# Altium footprint library SMD_Bauteile.PcbLib: 355 footprints (part 19 of 23)
Each footprint in its own frame and in the unit in brackets; x right, y up, seen from the top. Pads: shape width x height; smd on the part's side, far side on the other; paste and mask are expansions set on the pad; w line width, h text height; cw(c..) or ccw(c..) is an arc to the next point about the centre after c.
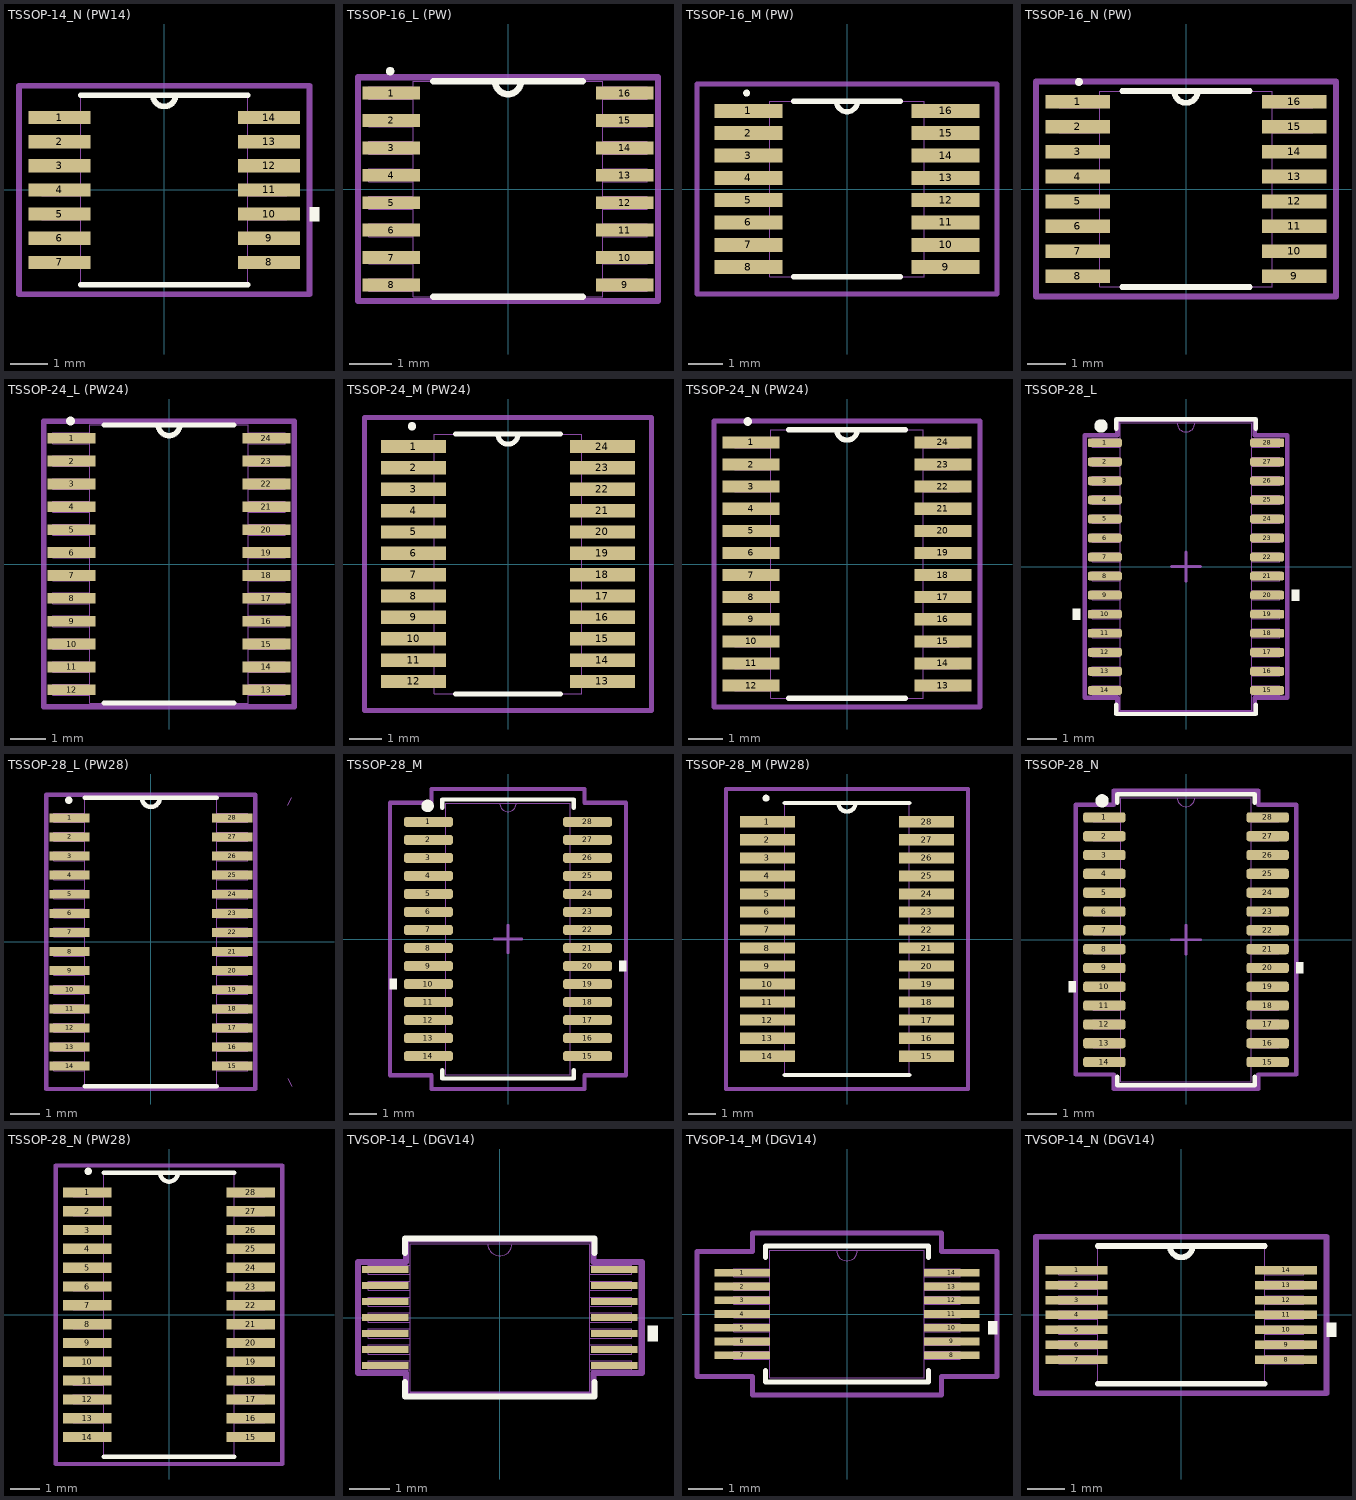
[diagram p18: the footprints below, top view; thin cyan lines are the x and y axes]

## TSSOP-14_N (PW14) [mil] "TSSOP, 14-Leads, Body 5.10x4.5mm, Pitch 0.65mm, IPC Medium Density"
height 47.24
pads (14):
  rect 66x14 smd: 1(-111,76.77) 2(-111,51.18) 3(-111,25.59) 4(-111,0) 5(-111,-25.59) 6(-111,-51.18) 7(-111,-76.77) 8(111,-76.77) 9(111,-51.18) 10(111,-25.59) 11(111,0) 12(111,25.59) 13(111,51.18) 14(111,76.77)
Top Overlay:
  region: 154,-18.09 164,-18.09 164,-33.09 154,-33.09
  lines w6: -88.5,-100.5 88.5,-100.5 ; -88.5,100.5 88.5,100.5 ; -12,100.5 ccw(c0,100.5) 12,100.5
Mech Misc 1:
  lines w0: -12,100.5 ccw(c0,100.5) 12,100.5
  lines w1: -130,-82.77 -88.5,-82.77 -88.5,-70.77 -130,-70.77 -130,-82.77 ; -130,-57.18 -88.5,-57.18 -88.5,-45.18 -130,-45.18 -130,-57.18 ; -130,-31.59 -88.5,-31.59 -88.5,-19.59 -130,-19.59 -130,-31.59 ; -130,-6 -88.5,-6 -88.5,6 -130,6 -130,-6 ; -130,19.59 -88.5,19.59 -88.5,31.59 -130,31.59 -130,19.59 ; -130,45.18 -88.5,45.18 -88.5,57.18 -130,57.18 -130,45.18 ; -130,70.77 -88.5,70.77 -88.5,82.77 -130,82.77 -130,70.77 ; -88.5,-100.5 -88.5,100.5 88.5,100.5 88.5,-100.5 -88.5,-100.5 ; 88.5,-82.77 130,-82.77 130,-70.77 88.5,-70.77 88.5,-82.77 ; 88.5,-57.18 130,-57.18 130,-45.18 88.5,-45.18 88.5,-57.18 ; 88.5,-31.59 130,-31.59 130,-19.59 88.5,-19.59 88.5,-31.59 ; 88.5,-6 130,-6 130,6 88.5,6 88.5,-6 ; 88.5,19.59 130,19.59 130,31.59 88.5,31.59 88.5,19.59 ; 88.5,45.18 130,45.18 130,57.18 88.5,57.18 88.5,45.18 ; 88.5,70.77 130,70.77 130,82.77 88.5,82.77 88.5,70.77
Mech 15:
  lines w6: -154,-110.5 154,-110.5 154,110.5 -154,110.5 -154,-110.5
3D body "PW0014A.stp": height 44.49, standoff 0, extent -125.98,-98.42 125.99,98.43

## TSSOP-16_L (PW) [mil]
height 47.24
pads (16):
  rect 54x12 smd: 1(-109,89.57) 2(-109,63.98) 3(-109,38.39) 4(-109,12.8) 5(-109,-12.8) 6(-109,-38.39) 7(-109,-63.98) 8(-109,-89.57) 9(109,-89.57) 10(109,-63.98) 11(109,-38.39) 12(109,-12.8) 13(109,12.8) 14(109,38.39) 15(109,63.98) 16(109,89.57)
Top Overlay:
  circle w7.87: c-110,110 r0.1
  lines w6: -69.86,-100.5 69.86,-100.5 ; -69.86,100.5 69.86,100.5 ; -12,100.5 ccw(c0,100.5) 12,100.5
Mech Misc 1:
  lines w0: -12,100.5 ccw(c0,100.5) 12,100.5
  lines w1: -130,-95.57 -130,-83.57 -88.5,-83.57 -88.5,-95.57 -130,-95.57 ; -130,-69.98 -130,-57.98 -88.5,-57.98 -88.5,-69.98 -130,-69.98 ; -130,-44.39 -130,-32.39 -88.5,-32.39 -88.5,-44.39 -130,-44.39 ; -130,-18.8 -130,-6.8 -88.5,-6.8 -88.5,-18.8 -130,-18.8 ; -130,6.8 -130,18.8 -88.5,18.8 -88.5,6.8 -130,6.8 ; -130,32.39 -130,44.39 -88.5,44.39 -88.5,32.39 -130,32.39 ; -130,57.98 -130,69.98 -88.5,69.98 -88.5,57.98 -130,57.98 ; -130,83.57 -130,95.57 -88.5,95.57 -88.5,83.57 -130,83.57 ; -88.5,-100.5 88.5,-100.5 88.5,100.5 -88.5,100.5 -88.5,-100.5 ; 88.5,-95.57 88.5,-83.57 130,-83.57 130,-95.57 88.5,-95.57 ; 88.5,-69.98 88.5,-57.98 130,-57.98 130,-69.98 88.5,-69.98 ; 88.5,-44.39 88.5,-32.39 130,-32.39 130,-44.39 88.5,-44.39 ; 88.5,-18.8 88.5,-6.8 130,-6.8 130,-18.8 88.5,-18.8 ; 88.5,6.8 88.5,18.8 130,18.8 130,6.8 88.5,6.8 ; 88.5,32.39 88.5,44.39 130,44.39 130,32.39 88.5,32.39 ; 88.5,57.98 88.5,69.98 130,69.98 130,57.98 88.5,57.98 ; 88.5,83.57 88.5,95.57 130,95.57 130,83.57 88.5,83.57
Mech 15:
  lines w6: -140,-104.5 -140,104.5 140,104.5 140,-104.5 -140,-104.5
3D body: height 10, standoff 0, extent 0,0 10,10
3D body "TSSOP-16 (PW).stp": height 44.49, standoff 0, extent -125.98,-98.42 125.99,98.43

## TSSOP-16_M (PW) [mil]
height 47.24
pads (16):
  rect 78x16 smd: 1(-113,89.57) 2(-113,63.98) 3(-113,38.39) 4(-113,12.8) 5(-113,-12.8) 6(-113,-38.39) 7(-113,-63.98) 8(-113,-89.57) 9(113,-89.57) 10(113,-63.98) 11(113,-38.39) 12(113,-12.8) 13(113,12.8) 14(113,38.39) 15(113,63.98) 16(113,89.57)
Top Overlay:
  circle w7.87: c-115.1,110 r0.1
  lines w6: -61.23,-100.5 61.23,-100.5 ; -61.23,100.5 61.23,100.5 ; -12,100.5 ccw(c0,100.5) 12,100.5
Mech Misc 1:
  lines w0: -12,100.5 ccw(c0,100.5) 12,100.5
  lines w1: -130,-95.57 -88.5,-95.57 -88.5,-83.57 -130,-83.57 -130,-95.57 ; -130,-69.98 -88.5,-69.98 -88.5,-57.98 -130,-57.98 -130,-69.98 ; -130,-44.39 -88.5,-44.39 -88.5,-32.39 -130,-32.39 -130,-44.39 ; -130,-18.8 -88.5,-18.8 -88.5,-6.8 -130,-6.8 -130,-18.8 ; -130,6.8 -88.5,6.8 -88.5,18.8 -130,18.8 -130,6.8 ; -130,32.39 -88.5,32.39 -88.5,44.39 -130,44.39 -130,32.39 ; -130,57.98 -88.5,57.98 -88.5,69.98 -130,69.98 -130,57.98 ; -130,83.57 -88.5,83.57 -88.5,95.57 -130,95.57 -130,83.57 ; -88.5,-100.5 -88.5,100.5 88.5,100.5 88.5,-100.5 -88.5,-100.5 ; 88.5,-95.57 130,-95.57 130,-83.57 88.5,-83.57 88.5,-95.57 ; 88.5,-69.98 130,-69.98 130,-57.98 88.5,-57.98 88.5,-69.98 ; 88.5,-44.39 130,-44.39 130,-32.39 88.5,-32.39 88.5,-44.39 ; 88.5,-18.8 130,-18.8 130,-6.8 88.5,-6.8 88.5,-18.8 ; 88.5,6.8 130,6.8 130,18.8 88.5,18.8 88.5,6.8 ; 88.5,32.39 130,32.39 130,44.39 88.5,44.39 88.5,32.39 ; 88.5,57.98 130,57.98 130,69.98 88.5,69.98 88.5,57.98 ; 88.5,83.57 130,83.57 130,95.57 88.5,95.57 88.5,83.57
Mech 15:
  lines w6: -172,-120.5 172,-120.5 172,120.5 -172,120.5 -172,-120.5
3D body: height 10, standoff 0, extent 0,0 10,10
3D body "TSSOP-16 (PW).stp": height 44.49, standoff 0, extent -125.98,-98.42 125.99,98.43

## TSSOP-16_N (PW) [mil]
height 47.24
pads (16):
  rect 66x14 smd: 1(-111,89.57) 2(-111,63.98) 3(-111,38.39) 4(-111,12.8) 5(-111,-12.8) 6(-111,-38.39) 7(-111,-63.98) 8(-111,-89.57) 9(111,-89.57) 10(111,-63.98) 11(111,-38.39) 12(111,-12.8) 13(111,12.8) 14(111,38.39) 15(111,63.98) 16(111,89.57)
Top Overlay:
  circle w7.87: c-110,110 r0.1
  lines w6: -65.5,-100.5 65.5,-100.5 ; -65.5,100.5 65.5,100.5 ; -12,100.5 ccw(c0,100.5) 12,100.5
Mech Misc 1:
  lines w0: -12,100.5 ccw(c0,100.5) 12,100.5
  lines w1: -130,-95.57 -88.5,-95.57 -88.5,-83.57 -130,-83.57 -130,-95.57 ; -130,-69.98 -88.5,-69.98 -88.5,-57.98 -130,-57.98 -130,-69.98 ; -130,-44.39 -88.5,-44.39 -88.5,-32.39 -130,-32.39 -130,-44.39 ; -130,-18.8 -88.5,-18.8 -88.5,-6.8 -130,-6.8 -130,-18.8 ; -130,6.8 -88.5,6.8 -88.5,18.8 -130,18.8 -130,6.8 ; -130,32.39 -88.5,32.39 -88.5,44.39 -130,44.39 -130,32.39 ; -130,57.98 -88.5,57.98 -88.5,69.98 -130,69.98 -130,57.98 ; -130,83.57 -88.5,83.57 -88.5,95.57 -130,95.57 -130,83.57 ; -88.5,-100.5 -88.5,100.5 88.5,100.5 88.5,-100.5 -88.5,-100.5 ; 88.5,-95.57 130,-95.57 130,-83.57 88.5,-83.57 88.5,-95.57 ; 88.5,-69.98 130,-69.98 130,-57.98 88.5,-57.98 88.5,-69.98 ; 88.5,-44.39 130,-44.39 130,-32.39 88.5,-32.39 88.5,-44.39 ; 88.5,-18.8 130,-18.8 130,-6.8 88.5,-6.8 88.5,-18.8 ; 88.5,6.8 130,6.8 130,18.8 88.5,18.8 88.5,6.8 ; 88.5,32.39 130,32.39 130,44.39 88.5,44.39 88.5,32.39 ; 88.5,57.98 130,57.98 130,69.98 88.5,69.98 88.5,57.98 ; 88.5,83.57 130,83.57 130,95.57 88.5,95.57 88.5,83.57
Mech 15:
  lines w6: -154,-110.5 154,-110.5 154,110.5 -154,110.5 -154,-110.5
3D body: height 10, standoff 0, extent 0,0 10,10
3D body "TSSOP-16 (PW).stp": height 44.49, standoff 0, extent -125.98,-98.42 125.99,98.43

## TSSOP-24_L (PW24) [mil]
height 47.24
pads (24):
  rect 54x12 smd: 1(-109,140.75) 2(-109,115.16) 3(-109,89.57) 4(-109,63.98) 5(-109,38.39) 6(-109,12.8) 7(-109,-12.8) 8(-109,-38.39) 9(-109,-63.98) 10(-109,-89.57) 11(-109,-115.16) 12(-109,-140.75) 13(109,-140.75) 14(109,-115.16) 15(109,-89.57) 16(109,-63.98) 17(109,-38.39) 18(109,-12.8) 19(109,12.8) 20(109,38.39) 21(109,63.98) 22(109,89.57) 23(109,115.16) 24(109,140.75)
Top Overlay:
  circle w10: c-110,160 r0.01
  lines w6: -72.25,-155.5 72.25,-155.5 ; -72.25,155.5 72.25,155.5 ; -12,155.5 ccw(c0,155.5) 12,155.5
Mech Misc 1:
  lines w0: -12,155.5 ccw(c0,155.5) 12,155.5
  lines w1: -130,-146.75 -88.5,-146.75 -88.5,-134.75 -130,-134.75 -130,-146.75 ; -130,-121.16 -88.5,-121.16 -88.5,-109.16 -130,-109.16 -130,-121.16 ; -130,-95.57 -88.5,-95.57 -88.5,-83.57 -130,-83.57 -130,-95.57 ; -130,-69.98 -88.5,-69.98 -88.5,-57.98 -130,-57.98 -130,-69.98 ; -130,-44.39 -88.5,-44.39 -88.5,-32.39 -130,-32.39 -130,-44.39 ; -130,-18.8 -88.5,-18.8 -88.5,-6.8 -130,-6.8 -130,-18.8 ; -130,6.8 -88.5,6.8 -88.5,18.8 -130,18.8 -130,6.8 ; -130,32.39 -88.5,32.39 -88.5,44.39 -130,44.39 -130,32.39 ; -130,57.98 -88.5,57.98 -88.5,69.98 -130,69.98 -130,57.98 ; -130,83.57 -88.5,83.57 -88.5,95.57 -130,95.57 -130,83.57 ; -130,109.16 -88.5,109.16 -88.5,121.16 -130,121.16 -130,109.16 ; -130,134.75 -88.5,134.75 -88.5,146.75 -130,146.75 -130,134.75 ; -88.5,-155.5 -88.5,155.5 88.5,155.5 88.5,-155.5 -88.5,-155.5 ; 88.5,-146.75 130,-146.75 130,-134.75 88.5,-134.75 88.5,-146.75 ; 88.5,-121.16 130,-121.16 130,-109.16 88.5,-109.16 88.5,-121.16 ; 88.5,-95.57 130,-95.57 130,-83.57 88.5,-83.57 88.5,-95.57 ; 88.5,-69.98 130,-69.98 130,-57.98 88.5,-57.98 88.5,-69.98 ; 88.5,-44.39 130,-44.39 130,-32.39 88.5,-32.39 88.5,-44.39 ; 88.5,-18.8 130,-18.8 130,-6.8 88.5,-6.8 88.5,-18.8 ; 88.5,6.8 130,6.8 130,18.8 88.5,18.8 88.5,6.8 ; 88.5,32.39 130,32.39 130,44.39 88.5,44.39 88.5,32.39 ; 88.5,57.98 130,57.98 130,69.98 88.5,69.98 88.5,57.98 ; 88.5,83.57 130,83.57 130,95.57 88.5,95.57 88.5,83.57 ; 88.5,109.16 130,109.16 130,121.16 88.5,121.16 88.5,109.16 ; 88.5,134.75 130,134.75 130,146.75 88.5,146.75 88.5,134.75
Mech 15:
  lines w6: -140,-159.5 140,-159.5 140,159.5 -140,159.5 -140,-159.5
3D body "TSSOP-24-PW.stp": height 44.49, standoff 0, extent -125.98,-153.54 125.99,153.55
3D body: height 10, standoff 0, extent 0,0 10,10

## TSSOP-24_M (PW24) [mil]
height 47.24
pads (24):
  rect 78x16 smd: 1(-113,140.75) 2(-113,115.16) 3(-113,89.57) 4(-113,63.98) 5(-113,38.39) 6(-113,12.8) 7(-113,-12.8) 8(-113,-38.39) 9(-113,-63.98) 10(-113,-89.57) 11(-113,-115.16) 12(-113,-140.75) 13(113,-140.75) 14(113,-115.16) 15(113,-89.57) 16(113,-63.98) 17(113,-38.39) 18(113,-12.8) 19(113,12.8) 20(113,38.39) 21(113,63.98) 22(113,89.57) 23(113,115.16) 24(113,140.75)
Top Overlay:
  circle w10: c-115,165 r0.01
  lines w6: -62.77,-155.5 62.77,-155.5 ; -62.77,155.5 62.77,155.5 ; -12,155.5 ccw(c0,155.5) 12,155.5
Mech Misc 1:
  lines w0: -12,155.5 ccw(c0,155.5) 12,155.5
  lines w1: -130,-146.75 -88.5,-146.75 -88.5,-134.75 -130,-134.75 -130,-146.75 ; -130,-121.16 -88.5,-121.16 -88.5,-109.16 -130,-109.16 -130,-121.16 ; -130,-95.57 -88.5,-95.57 -88.5,-83.57 -130,-83.57 -130,-95.57 ; -130,-69.98 -88.5,-69.98 -88.5,-57.98 -130,-57.98 -130,-69.98 ; -130,-44.39 -88.5,-44.39 -88.5,-32.39 -130,-32.39 -130,-44.39 ; -130,-18.8 -88.5,-18.8 -88.5,-6.8 -130,-6.8 -130,-18.8 ; -130,6.8 -88.5,6.8 -88.5,18.8 -130,18.8 -130,6.8 ; -130,32.39 -88.5,32.39 -88.5,44.39 -130,44.39 -130,32.39 ; -130,57.98 -88.5,57.98 -88.5,69.98 -130,69.98 -130,57.98 ; -130,83.57 -88.5,83.57 -88.5,95.57 -130,95.57 -130,83.57 ; -130,109.16 -88.5,109.16 -88.5,121.16 -130,121.16 -130,109.16 ; -130,134.75 -88.5,134.75 -88.5,146.75 -130,146.75 -130,134.75 ; -88.5,-155.5 -88.5,155.5 88.5,155.5 88.5,-155.5 -88.5,-155.5 ; 88.5,-146.75 130,-146.75 130,-134.75 88.5,-134.75 88.5,-146.75 ; 88.5,-121.16 130,-121.16 130,-109.16 88.5,-109.16 88.5,-121.16 ; 88.5,-95.57 130,-95.57 130,-83.57 88.5,-83.57 88.5,-95.57 ; 88.5,-69.98 130,-69.98 130,-57.98 88.5,-57.98 88.5,-69.98 ; 88.5,-44.39 130,-44.39 130,-32.39 88.5,-32.39 88.5,-44.39 ; 88.5,-18.8 130,-18.8 130,-6.8 88.5,-6.8 88.5,-18.8 ; 88.5,6.8 130,6.8 130,18.8 88.5,18.8 88.5,6.8 ; 88.5,32.39 130,32.39 130,44.39 88.5,44.39 88.5,32.39 ; 88.5,57.98 130,57.98 130,69.98 88.5,69.98 88.5,57.98 ; 88.5,83.57 130,83.57 130,95.57 88.5,95.57 88.5,83.57 ; 88.5,109.16 130,109.16 130,121.16 88.5,121.16 88.5,109.16 ; 88.5,134.75 130,134.75 130,146.75 88.5,146.75 88.5,134.75
Mech 15:
  lines w6: -172,-175.5 172,-175.5 172,175.5 -172,175.5 -172,-175.5
3D body: height 10, standoff 0, extent 0,0 10,10
3D body "TSSOP-24-PW.stp": height 44.49, standoff 0, extent -125.98,-153.53 125.99,153.55

## TSSOP-24_N (PW24) [mil]
height 47.24
pads (24):
  rect 66x14 smd: 1(-111,140.75) 2(-111,115.16) 3(-111,89.57) 4(-111,63.98) 5(-111,38.39) 6(-111,12.8) 7(-111,-12.8) 8(-111,-38.39) 9(-111,-63.98) 10(-111,-89.57) 11(-111,-115.16) 12(-111,-140.75) 13(111,-140.75) 14(111,-115.16) 15(111,-89.57) 16(111,-63.98) 17(111,-38.39) 18(111,-12.8) 19(111,12.8) 20(111,38.39) 21(111,63.98) 22(111,89.57) 23(111,115.16) 24(111,140.75)
Top Overlay:
  circle w10: c-115,165 r0.01
  lines w6: -67.44,-155.5 67.44,-155.5 ; -67.44,155.5 67.44,155.5 ; -12,155.5 ccw(c0,155.5) 12,155.5
Mech Misc 1:
  lines w0: -12,155.5 ccw(c0,155.5) 12,155.5
  lines w1: -130,-146.75 -88.5,-146.75 -88.5,-134.75 -130,-134.75 -130,-146.75 ; -130,-121.16 -88.5,-121.16 -88.5,-109.16 -130,-109.16 -130,-121.16 ; -130,-95.57 -88.5,-95.57 -88.5,-83.57 -130,-83.57 -130,-95.57 ; -130,-69.98 -88.5,-69.98 -88.5,-57.98 -130,-57.98 -130,-69.98 ; -130,-44.39 -88.5,-44.39 -88.5,-32.39 -130,-32.39 -130,-44.39 ; -130,-18.8 -88.5,-18.8 -88.5,-6.8 -130,-6.8 -130,-18.8 ; -130,6.8 -88.5,6.8 -88.5,18.8 -130,18.8 -130,6.8 ; -130,32.39 -88.5,32.39 -88.5,44.39 -130,44.39 -130,32.39 ; -130,57.98 -88.5,57.98 -88.5,69.98 -130,69.98 -130,57.98 ; -130,83.57 -88.5,83.57 -88.5,95.57 -130,95.57 -130,83.57 ; -130,109.16 -88.5,109.16 -88.5,121.16 -130,121.16 -130,109.16 ; -130,134.75 -88.5,134.75 -88.5,146.75 -130,146.75 -130,134.75 ; -88.5,-155.5 -88.5,155.5 88.5,155.5 88.5,-155.5 -88.5,-155.5 ; 88.5,-146.75 130,-146.75 130,-134.75 88.5,-134.75 88.5,-146.75 ; 88.5,-121.16 130,-121.16 130,-109.16 88.5,-109.16 88.5,-121.16 ; 88.5,-95.57 130,-95.57 130,-83.57 88.5,-83.57 88.5,-95.57 ; 88.5,-69.98 130,-69.98 130,-57.98 88.5,-57.98 88.5,-69.98 ; 88.5,-44.39 130,-44.39 130,-32.39 88.5,-32.39 88.5,-44.39 ; 88.5,-18.8 130,-18.8 130,-6.8 88.5,-6.8 88.5,-18.8 ; 88.5,6.8 130,6.8 130,18.8 88.5,18.8 88.5,6.8 ; 88.5,32.39 130,32.39 130,44.39 88.5,44.39 88.5,32.39 ; 88.5,57.98 130,57.98 130,69.98 88.5,69.98 88.5,57.98 ; 88.5,83.57 130,83.57 130,95.57 88.5,95.57 88.5,83.57 ; 88.5,109.16 130,109.16 130,121.16 88.5,121.16 88.5,109.16 ; 88.5,134.75 130,134.75 130,146.75 88.5,146.75 88.5,134.75
Mech 15:
  lines w6: -154,-165.5 154,-165.5 154,165.5 -154,165.5 -154,-165.5
3D body: height 10, standoff 0, extent 0,0 10,10
3D body "TSSOP-24-PW.stp": height 44.49, standoff 0, extent -125.98,-153.54 125.99,153.55

## TSSOP-28_L [mm]
height 1.1
pads (28):
  rrect50% 1.162x0.305 smd: 1(-2.769,4.225) 2(-2.769,3.575) 3(-2.769,2.925) 4(-2.769,2.275) 5(-2.769,1.625) 6(-2.769,0.975) 7(-2.769,0.325) 8(-2.769,-0.325) 9(-2.769,-0.975) 10(-2.769,-1.625) 11(-2.769,-2.275) 12(-2.769,-2.925) 13(-2.769,-3.575) 14(-2.769,-4.225) 15(2.769,-4.225) 16(2.769,-3.575) 17(2.769,-2.925) 18(2.769,-2.275) 19(2.769,-1.625) 20(2.769,-0.975) 21(2.769,-0.325) 22(2.769,0.325) 23(2.769,0.975) 24(2.769,1.625) 25(2.769,2.275) 26(2.769,2.925) 27(2.769,3.575) 28(2.769,4.225)
Top Overlay:
  circle w0.254: c-2.9,4.8 r0.1
  region: 3.604,-0.784 3.858,-0.784 3.858,-1.165 3.604,-1.165
  region: -3.604,-1.434 -3.858,-1.434 -3.858,-1.815 -3.604,-1.815
  lines w0.152: -2.375,-4.71 -2.375,-5.029 2.375,-5.029 2.375,-4.71 ; -2.375,4.71 -2.375,5.029 2.375,5.029 2.375,4.71
Bottom Designator:
  lines w0.152: -3.452,-4.479 -2.349,-4.479 -2.349,-5.004 2.349,-5.004 2.349,-4.479 3.452,-4.479 3.452,4.479 2.349,4.479 2.349,5.004 -2.349,5.004 -2.349,4.479 -3.452,4.479 -3.452,-4.479
Bottom 3D Body:
  lines w0.1: -0.5,0 0.5,0 ; 0,-0.5 0,0.5
Top Courtyard (Mech14):
  lines w0: -0.305,4.902 ccw(c0,4.902) 0.305,4.902
  lines w0.025: -3.2,-4.377 -3.2,-4.073 -2.248,-4.073 -2.248,-4.377 -3.2,-4.377 ; -3.2,-3.727 -2.248,-3.727 -2.248,-3.423 -3.2,-3.423 -3.2,-3.727 ; -3.2,-3.077 -3.2,-2.773 -2.248,-2.773 -2.248,-3.077 -3.2,-3.077 ; -3.2,-2.427 -3.2,-2.123 -2.248,-2.123 -2.248,-2.427 -3.2,-2.427 ; -3.2,-1.777 -2.248,-1.777 -2.248,-1.473 -3.2,-1.473 -3.2,-1.777 ; -3.2,-1.127 -3.2,-0.823 -2.248,-0.823 -2.248,-1.127 -3.2,-1.127 ; -3.2,-0.477 -3.2,-0.173 -2.248,-0.173 -2.248,-0.477 -3.2,-0.477 ; -3.2,0.173 -2.248,0.173 -2.248,0.477 -3.2,0.477 -3.2,0.173 ; -3.2,0.823 -3.2,1.127 -2.248,1.127 -2.248,0.823 -3.2,0.823 ; -3.2,1.473 -3.2,1.777 -2.248,1.777 -2.248,1.473 -3.2,1.473 ; -3.2,2.123 -3.2,2.427 -2.248,2.427 -2.248,2.123 -3.2,2.123 ; -3.2,2.773 -2.248,2.773 -2.248,3.077 -3.2,3.077 -3.2,2.773 ; -3.2,3.423 -3.2,3.727 -2.248,3.727 -2.248,3.423 -3.2,3.423 ; -3.2,4.073 -3.2,4.377 -2.248,4.377 -2.248,4.073 -3.2,4.073 ; -2.248,-4.902 -2.248,4.902 2.248,4.902 2.248,-4.902 -2.248,-4.902 ; 2.248,-4.377 2.248,-4.073 3.2,-4.073 3.2,-4.377 2.248,-4.377 ; 2.248,-3.727 2.248,-3.423 3.2,-3.423 3.2,-3.727 2.248,-3.727 ; 2.248,-3.077 2.248,-2.773 3.2,-2.773 3.2,-3.077 2.248,-3.077 ; 2.248,-2.427 2.248,-2.123 3.2,-2.123 3.2,-2.427 2.248,-2.427 ; 2.248,-1.777 2.248,-1.473 3.2,-1.473 3.2,-1.777 2.248,-1.777 ; 2.248,-1.127 2.248,-0.823 3.2,-0.823 3.2,-1.127 2.248,-1.127 ; 2.248,-0.477 2.248,-0.173 3.2,-0.173 3.2,-0.477 2.248,-0.477 ; 2.248,0.173 2.248,0.477 3.2,0.477 3.2,0.173 2.248,0.173 ; 2.248,0.823 3.2,0.823 3.2,1.127 2.248,1.127 2.248,0.823 ; 2.248,1.473 2.248,1.777 3.2,1.777 3.2,1.473 2.248,1.473 ; 2.248,2.123 2.248,2.427 3.2,2.427 3.2,2.123 2.248,2.123 ; 2.248,2.773 3.2,2.773 3.2,3.077 2.248,3.077 2.248,2.773 ; 2.248,3.423 2.248,3.727 3.2,3.727 3.2,3.423 2.248,3.423 ; 2.248,4.073 2.248,4.377 3.2,4.377 3.2,4.073 2.248,4.073
3D body "RU_28_ADI.step": height 1.2, standoff 0, extent -3.2,-4.902 3.2,4.902

## TSSOP-28_L (PW28) [mil]
height 47.24
pads (28):
  rect 54x12 smd: 1(-109,166.34) 2(-109,140.75) 3(-109,115.16) 4(-109,89.57) 5(-109,63.98) 6(-109,38.39) 7(-109,12.8) 8(-109,-12.8) 9(-109,-38.39) 10(-109,-63.98) 11(-109,-89.57) 12(-109,-115.16) 13(-109,-140.75) 14(-109,-166.34) 15(109,-166.34) 16(109,-140.75) 17(109,-115.16) 18(109,-89.57) 19(109,-63.98) 20(109,-38.39) 21(109,-12.8) 22(109,12.8) 23(109,38.39) 24(109,63.98) 25(109,89.57) 26(109,115.16) 27(109,140.75) 28(109,166.34)
Top Overlay:
  circle w10: c-110,190 r0.01
  lines w6: -88.5,-193 88.5,-193 ; -88.5,193 88.5,193 ; -12,193 ccw(c0,193) 12,193
Top Courtyard:
  lines w1: 183.5,-183 188.5,-193 ; 183.5,183 188.5,193
Mech Misc 1:
  lines w0: -12,193 ccw(c0,193) 12,193
  lines w1: -130,-172.34 -130,-160.34 -88.5,-160.34 -88.5,-172.34 -130,-172.34 ; -130,-146.75 -130,-134.75 -88.5,-134.75 -88.5,-146.75 -130,-146.75 ; -130,-121.16 -130,-109.16 -88.5,-109.16 -88.5,-121.16 -130,-121.16 ; -130,-95.57 -130,-83.57 -88.5,-83.57 -88.5,-95.57 -130,-95.57 ; -130,-69.98 -130,-57.98 -88.5,-57.98 -88.5,-69.98 -130,-69.98 ; -130,-44.39 -130,-32.39 -88.5,-32.39 -88.5,-44.39 -130,-44.39 ; -130,-18.8 -130,-6.8 -88.5,-6.8 -88.5,-18.8 -130,-18.8 ; -130,6.8 -130,18.8 -88.5,18.8 -88.5,6.8 -130,6.8 ; -130,32.39 -130,44.39 -88.5,44.39 -88.5,32.39 -130,32.39 ; -130,57.98 -130,69.98 -88.5,69.98 -88.5,57.98 -130,57.98 ; -130,83.57 -130,95.57 -88.5,95.57 -88.5,83.57 -130,83.57 ; -130,109.16 -130,121.16 -88.5,121.16 -88.5,109.16 -130,109.16 ; -130,134.75 -130,146.75 -88.5,146.75 -88.5,134.75 -130,134.75 ; -130,160.34 -130,172.34 -88.5,172.34 -88.5,160.34 -130,160.34 ; -88.5,-193 88.5,-193 88.5,193 -88.5,193 -88.5,-193 ; 88.5,-172.34 88.5,-160.34 130,-160.34 130,-172.34 88.5,-172.34 ; 88.5,-146.75 88.5,-134.75 130,-134.75 130,-146.75 88.5,-146.75 ; 88.5,-121.16 88.5,-109.16 130,-109.16 130,-121.16 88.5,-121.16 ; 88.5,-95.57 88.5,-83.57 130,-83.57 130,-95.57 88.5,-95.57 ; 88.5,-69.98 88.5,-57.98 130,-57.98 130,-69.98 88.5,-69.98 ; 88.5,-44.39 88.5,-32.39 130,-32.39 130,-44.39 88.5,-44.39 ; 88.5,-18.8 88.5,-6.8 130,-6.8 130,-18.8 88.5,-18.8 ; 88.5,6.8 88.5,18.8 130,18.8 130,6.8 88.5,6.8 ; 88.5,32.39 88.5,44.39 130,44.39 130,32.39 88.5,32.39 ; 88.5,57.98 88.5,69.98 130,69.98 130,57.98 88.5,57.98 ; 88.5,83.57 88.5,95.57 130,95.57 130,83.57 88.5,83.57 ; 88.5,109.16 88.5,121.16 130,121.16 130,109.16 88.5,109.16 ; 88.5,134.75 88.5,146.75 130,146.75 130,134.75 88.5,134.75 ; 88.5,160.34 88.5,172.34 130,172.34 130,160.34 88.5,160.34
Mech 15:
  lines w6: -140,-197 -140,197 140,197 140,-197 -140,-197
3D body: height 10, standoff 0, extent 0,0 10,10
3D body "TSSOP-28.stp": height 44.49, standoff 0, extent -125.98,-190.94 125.99,190.95

## TSSOP-28_M [mm]
height 1.1
pads (28):
  rrect50% 1.762x0.355 smd: 1(-2.869,4.225) 2(-2.869,3.575) 3(-2.869,2.925) 4(-2.869,2.275) 5(-2.869,1.625) 6(-2.869,0.975) 7(-2.869,0.325) 8(-2.869,-0.325) 9(-2.869,-0.975) 10(-2.869,-1.625) 11(-2.869,-2.275) 12(-2.869,-2.925) 13(-2.869,-3.575) 14(-2.869,-4.225) 15(2.869,-4.225) 16(2.869,-3.575) 17(2.869,-2.925) 18(2.869,-2.275) 19(2.869,-1.625) 20(2.869,-0.975) 21(2.869,-0.325) 22(2.869,0.325) 23(2.869,0.975) 24(2.869,1.625) 25(2.869,2.275) 26(2.869,2.925) 27(2.869,3.575) 28(2.869,4.225)
Top Overlay:
  circle w0.254: c-2.9,4.8 r0.1
  region: -4.004,-1.434 -4.258,-1.434 -4.258,-1.815 -4.004,-1.815
  region: 4.004,-0.784 4.258,-0.784 4.258,-1.165 4.004,-1.165
  lines w0.152: -2.375,-4.735 -2.375,-5.029 2.375,-5.029 2.375,-4.735 ; -2.375,4.735 -2.375,5.029 2.375,5.029 2.375,4.735
Bottom Designator:
  lines w0.152: -4.258,-4.91 -4.258,4.91 -2.756,4.91 -2.756,5.41 2.756,5.41 2.756,4.91 4.258,4.91 4.258,-4.91 2.756,-4.91 2.756,-5.41 -2.756,-5.41 -2.756,-4.91 -4.258,-4.91
Bottom 3D Body:
  lines w0.1: -0.5,0 0.5,0 ; 0,-0.5 0,0.5
Top Courtyard (Mech14):
  lines w0: -0.305,4.902 ccw(c0,4.902) 0.305,4.902
  lines w0.025: -3.2,-4.377 -2.248,-4.377 -2.248,-4.073 -3.2,-4.073 -3.2,-4.377 ; -3.2,-3.727 -3.2,-3.423 -2.248,-3.423 -2.248,-3.727 -3.2,-3.727 ; -3.2,-3.077 -2.248,-3.077 -2.248,-2.773 -3.2,-2.773 -3.2,-3.077 ; -3.2,-2.427 -2.248,-2.427 -2.248,-2.123 -3.2,-2.123 -3.2,-2.427 ; -3.2,-1.777 -3.2,-1.473 -2.248,-1.473 -2.248,-1.777 -3.2,-1.777 ; -3.2,-1.127 -3.2,-0.823 -2.248,-0.823 -2.248,-1.127 -3.2,-1.127 ; -3.2,-0.477 -2.248,-0.477 -2.248,-0.173 -3.2,-0.173 -3.2,-0.477 ; -3.2,0.173 -2.248,0.173 -2.248,0.477 -3.2,0.477 -3.2,0.173 ; -3.2,0.823 -2.248,0.823 -2.248,1.127 -3.2,1.127 -3.2,0.823 ; -3.2,1.473 -2.248,1.473 -2.248,1.777 -3.2,1.777 -3.2,1.473 ; -3.2,2.123 -3.2,2.427 -2.248,2.427 -2.248,2.123 -3.2,2.123 ; -3.2,2.773 -2.248,2.773 -2.248,3.077 -3.2,3.077 -3.2,2.773 ; -3.2,3.423 -2.248,3.423 -2.248,3.727 -3.2,3.727 -3.2,3.423 ; -3.2,4.073 -3.2,4.377 -2.248,4.377 -2.248,4.073 -3.2,4.073 ; -2.248,-4.902 -2.248,4.902 2.248,4.902 2.248,-4.902 -2.248,-4.902 ; 2.248,-4.377 2.248,-4.073 3.2,-4.073 3.2,-4.377 2.248,-4.377 ; 2.248,-3.727 3.2,-3.727 3.2,-3.423 2.248,-3.423 2.248,-3.727 ; 2.248,-3.077 3.2,-3.077 3.2,-2.773 2.248,-2.773 2.248,-3.077 ; 2.248,-2.427 3.2,-2.427 3.2,-2.123 2.248,-2.123 2.248,-2.427 ; 2.248,-1.777 3.2,-1.777 3.2,-1.473 2.248,-1.473 2.248,-1.777 ; 2.248,-1.127 3.2,-1.127 3.2,-0.823 2.248,-0.823 2.248,-1.127 ; 2.248,-0.477 3.2,-0.477 3.2,-0.173 2.248,-0.173 2.248,-0.477 ; 2.248,0.173 3.2,0.173 3.2,0.477 2.248,0.477 2.248,0.173 ; 2.248,0.823 3.2,0.823 3.2,1.127 2.248,1.127 2.248,0.823 ; 2.248,1.473 3.2,1.473 3.2,1.777 2.248,1.777 2.248,1.473 ; 2.248,2.123 2.248,2.427 3.2,2.427 3.2,2.123 2.248,2.123 ; 2.248,2.773 3.2,2.773 3.2,3.077 2.248,3.077 2.248,2.773 ; 2.248,3.423 3.2,3.423 3.2,3.727 2.248,3.727 2.248,3.423 ; 2.248,4.073 3.2,4.073 3.2,4.377 2.248,4.377 2.248,4.073
3D body "RU_28_ADI.step": height 1.2, standoff 0, extent -3.2,-4.902 3.2,4.902

## TSSOP-28_M (PW28) [mil]
height 47.24
pads (28):
  rect 78x16 smd: 1(-113,166.34) 2(-113,140.75) 3(-113,115.16) 4(-113,89.57) 5(-113,63.98) 6(-113,38.39) 7(-113,12.8) 8(-113,-12.8) 9(-113,-38.39) 10(-113,-63.98) 11(-113,-89.57) 12(-113,-115.16) 13(-113,-140.75) 14(-113,-166.34) 15(113,-166.34) 16(113,-140.75) 17(113,-115.16) 18(113,-89.57) 19(113,-63.98) 20(113,-38.39) 21(113,-12.8) 22(113,12.8) 23(113,38.39) 24(113,63.98) 25(113,89.57) 26(113,115.16) 27(113,140.75) 28(113,166.34)
Top Overlay:
  circle w10: c-115,200 r0.01
  lines w6: -88.5,-193 88.5,-193 ; -88.5,193 88.5,193 ; -12,193 ccw(c0,193) 12,193
Mech Misc 1:
  lines w0: -12,193 ccw(c0,193) 12,193
  lines w1: -130,-172.34 -130,-160.34 -88.5,-160.34 -88.5,-172.34 -130,-172.34 ; -130,-146.75 -130,-134.75 -88.5,-134.75 -88.5,-146.75 -130,-146.75 ; -130,-121.16 -130,-109.16 -88.5,-109.16 -88.5,-121.16 -130,-121.16 ; -130,-95.57 -130,-83.57 -88.5,-83.57 -88.5,-95.57 -130,-95.57 ; -130,-69.98 -130,-57.98 -88.5,-57.98 -88.5,-69.98 -130,-69.98 ; -130,-44.39 -130,-32.39 -88.5,-32.39 -88.5,-44.39 -130,-44.39 ; -130,-18.8 -130,-6.8 -88.5,-6.8 -88.5,-18.8 -130,-18.8 ; -130,6.8 -130,18.8 -88.5,18.8 -88.5,6.8 -130,6.8 ; -130,32.39 -130,44.39 -88.5,44.39 -88.5,32.39 -130,32.39 ; -130,57.98 -130,69.98 -88.5,69.98 -88.5,57.98 -130,57.98 ; -130,83.57 -130,95.57 -88.5,95.57 -88.5,83.57 -130,83.57 ; -130,109.16 -130,121.16 -88.5,121.16 -88.5,109.16 -130,109.16 ; -130,134.75 -130,146.75 -88.5,146.75 -88.5,134.75 -130,134.75 ; -130,160.34 -130,172.34 -88.5,172.34 -88.5,160.34 -130,160.34 ; -88.5,-193 88.5,-193 88.5,193 -88.5,193 -88.5,-193 ; 88.5,-172.34 88.5,-160.34 130,-160.34 130,-172.34 88.5,-172.34 ; 88.5,-146.75 88.5,-134.75 130,-134.75 130,-146.75 88.5,-146.75 ; 88.5,-121.16 88.5,-109.16 130,-109.16 130,-121.16 88.5,-121.16 ; 88.5,-95.57 88.5,-83.57 130,-83.57 130,-95.57 88.5,-95.57 ; 88.5,-69.98 88.5,-57.98 130,-57.98 130,-69.98 88.5,-69.98 ; 88.5,-44.39 88.5,-32.39 130,-32.39 130,-44.39 88.5,-44.39 ; 88.5,-18.8 88.5,-6.8 130,-6.8 130,-18.8 88.5,-18.8 ; 88.5,6.8 88.5,18.8 130,18.8 130,6.8 88.5,6.8 ; 88.5,32.39 88.5,44.39 130,44.39 130,32.39 88.5,32.39 ; 88.5,57.98 88.5,69.98 130,69.98 130,57.98 88.5,57.98 ; 88.5,83.57 88.5,95.57 130,95.57 130,83.57 88.5,83.57 ; 88.5,109.16 88.5,121.16 130,121.16 130,109.16 88.5,109.16 ; 88.5,134.75 88.5,146.75 130,146.75 130,134.75 88.5,134.75 ; 88.5,160.34 88.5,172.34 130,172.34 130,160.34 88.5,160.34
Mech 15:
  lines w6: -172,-213 -172,213 172,213 172,-213 -172,-213
3D body: height 10, standoff 0, extent 0,0 10,10
3D body "TSSOP-28.stp": height 44.49, standoff 0, extent -125.98,-190.94 125.99,190.95

## TSSOP-28_N [mm]
height 1.1
pads (28):
  rrect50% 1.462x0.355 smd: 1(-2.819,4.225) 2(-2.819,3.575) 3(-2.819,2.925) 4(-2.819,2.275) 5(-2.819,1.625) 6(-2.819,0.975) 7(-2.819,0.325) 8(-2.819,-0.325) 9(-2.819,-0.975) 10(-2.819,-1.625) 11(-2.819,-2.275) 12(-2.819,-2.925) 13(-2.819,-3.575) 14(-2.819,-4.225) 15(2.819,-4.225) 16(2.819,-3.575) 17(2.819,-2.925) 18(2.819,-2.275) 19(2.819,-1.625) 20(2.819,-0.975) 21(2.819,-0.325) 22(2.819,0.325) 23(2.819,0.975) 24(2.819,1.625) 25(2.819,2.275) 26(2.819,2.925) 27(2.819,3.575) 28(2.819,4.225)
Top Overlay:
  circle w0.254: c-2.9,4.8 r0.1
  region: -3.804,-1.434 -4.058,-1.434 -4.058,-1.815 -3.804,-1.815
  region: 3.804,-0.784 4.058,-0.784 4.058,-1.165 3.804,-1.165
  lines w0.152: -2.375,-4.735 -2.375,-5.029 2.375,-5.029 2.375,-4.735 ; -2.375,4.735 -2.375,5.029 2.375,5.029 2.375,4.735
Bottom Designator:
  lines w0.152: -3.804,-4.656 -3.804,4.656 -2.502,4.656 -2.502,5.156 2.502,5.156 2.502,4.656 3.804,4.656 3.804,-4.656 2.502,-4.656 2.502,-5.156 -2.502,-5.156 -2.502,-4.656 -3.804,-4.656
Bottom 3D Body:
  lines w0.1: -0.5,0 0.5,0 ; 0,-0.5 0,0.5
Top Courtyard (Mech14):
  lines w0: -0.305,4.902 ccw(c0,4.902) 0.305,4.902
  lines w0.025: -3.2,-4.377 -2.248,-4.377 -2.248,-4.073 -3.2,-4.073 -3.2,-4.377 ; -3.2,-3.727 -3.2,-3.423 -2.248,-3.423 -2.248,-3.727 -3.2,-3.727 ; -3.2,-3.077 -2.248,-3.077 -2.248,-2.773 -3.2,-2.773 -3.2,-3.077 ; -3.2,-2.427 -2.248,-2.427 -2.248,-2.123 -3.2,-2.123 -3.2,-2.427 ; -3.2,-1.777 -3.2,-1.473 -2.248,-1.473 -2.248,-1.777 -3.2,-1.777 ; -3.2,-1.127 -2.248,-1.127 -2.248,-0.823 -3.2,-0.823 -3.2,-1.127 ; -3.2,-0.477 -2.248,-0.477 -2.248,-0.173 -3.2,-0.173 -3.2,-0.477 ; -3.2,0.173 -2.248,0.173 -2.248,0.477 -3.2,0.477 -3.2,0.173 ; -3.2,0.823 -2.248,0.823 -2.248,1.127 -3.2,1.127 -3.2,0.823 ; -3.2,1.473 -2.248,1.473 -2.248,1.777 -3.2,1.777 -3.2,1.473 ; -3.2,2.123 -2.248,2.123 -2.248,2.427 -3.2,2.427 -3.2,2.123 ; -3.2,2.773 -2.248,2.773 -2.248,3.077 -3.2,3.077 -3.2,2.773 ; -3.2,3.423 -2.248,3.423 -2.248,3.727 -3.2,3.727 -3.2,3.423 ; -3.2,4.073 -2.248,4.073 -2.248,4.377 -3.2,4.377 -3.2,4.073 ; -2.248,-4.902 2.248,-4.902 2.248,4.902 -2.248,4.902 -2.248,-4.902 ; 2.248,-4.377 2.248,-4.073 3.2,-4.073 3.2,-4.377 2.248,-4.377 ; 2.248,-3.727 3.2,-3.727 3.2,-3.423 2.248,-3.423 2.248,-3.727 ; 2.248,-3.077 3.2,-3.077 3.2,-2.773 2.248,-2.773 2.248,-3.077 ; 2.248,-2.427 3.2,-2.427 3.2,-2.123 2.248,-2.123 2.248,-2.427 ; 2.248,-1.777 3.2,-1.777 3.2,-1.473 2.248,-1.473 2.248,-1.777 ; 2.248,-1.127 3.2,-1.127 3.2,-0.823 2.248,-0.823 2.248,-1.127 ; 2.248,-0.477 3.2,-0.477 3.2,-0.173 2.248,-0.173 2.248,-0.477 ; 2.248,0.173 3.2,0.173 3.2,0.477 2.248,0.477 2.248,0.173 ; 2.248,0.823 3.2,0.823 3.2,1.127 2.248,1.127 2.248,0.823 ; 2.248,1.473 3.2,1.473 3.2,1.777 2.248,1.777 2.248,1.473 ; 2.248,2.123 3.2,2.123 3.2,2.427 2.248,2.427 2.248,2.123 ; 2.248,2.773 2.248,3.077 3.2,3.077 3.2,2.773 2.248,2.773 ; 2.248,3.423 3.2,3.423 3.2,3.727 2.248,3.727 2.248,3.423 ; 2.248,4.073 3.2,4.073 3.2,4.377 2.248,4.377 2.248,4.073
3D body "RU_28_ADI.step": height 1.2, standoff 0, extent -3.2,-4.902 3.2,4.902

## TSSOP-28_N (PW28) [mil]
height 47.24
pads (28):
  rect 66x14 smd: 1(-111,166.34) 2(-111,140.75) 3(-111,115.16) 4(-111,89.57) 5(-111,63.98) 6(-111,38.39) 7(-111,12.8) 8(-111,-12.8) 9(-111,-38.39) 10(-111,-63.98) 11(-111,-89.57) 12(-111,-115.16) 13(-111,-140.75) 14(-111,-166.34) 15(111,-166.34) 16(111,-140.75) 17(111,-115.16) 18(111,-89.57) 19(111,-63.98) 20(111,-38.39) 21(111,-12.8) 22(111,12.8) 23(111,38.39) 24(111,63.98) 25(111,89.57) 26(111,115.16) 27(111,140.75) 28(111,166.34)
Top Overlay:
  circle w10: c-110,195 r0.01
  lines w6: -88.5,-193 88.5,-193 ; -88.5,193 88.5,193 ; -12,193 ccw(c0,193) 12,193
Mech Misc 1:
  lines w0: -12,193 ccw(c0,193) 12,193
  lines w1: -130,-172.34 -88.5,-172.34 -88.5,-160.34 -130,-160.34 -130,-172.34 ; -130,-146.75 -88.5,-146.75 -88.5,-134.75 -130,-134.75 -130,-146.75 ; -130,-121.16 -88.5,-121.16 -88.5,-109.16 -130,-109.16 -130,-121.16 ; -130,-95.57 -88.5,-95.57 -88.5,-83.57 -130,-83.57 -130,-95.57 ; -130,-69.98 -88.5,-69.98 -88.5,-57.98 -130,-57.98 -130,-69.98 ; -130,-44.39 -88.5,-44.39 -88.5,-32.39 -130,-32.39 -130,-44.39 ; -130,-18.8 -88.5,-18.8 -88.5,-6.8 -130,-6.8 -130,-18.8 ; -130,6.8 -88.5,6.8 -88.5,18.8 -130,18.8 -130,6.8 ; -130,32.39 -88.5,32.39 -88.5,44.39 -130,44.39 -130,32.39 ; -130,57.98 -88.5,57.98 -88.5,69.98 -130,69.98 -130,57.98 ; -130,83.57 -88.5,83.57 -88.5,95.57 -130,95.57 -130,83.57 ; -130,109.16 -88.5,109.16 -88.5,121.16 -130,121.16 -130,109.16 ; -130,134.75 -88.5,134.75 -88.5,146.75 -130,146.75 -130,134.75 ; -130,160.34 -88.5,160.34 -88.5,172.34 -130,172.34 -130,160.34 ; -88.5,-193 -88.5,193 88.5,193 88.5,-193 -88.5,-193 ; 88.5,-172.34 130,-172.34 130,-160.34 88.5,-160.34 88.5,-172.34 ; 88.5,-146.75 130,-146.75 130,-134.75 88.5,-134.75 88.5,-146.75 ; 88.5,-121.16 130,-121.16 130,-109.16 88.5,-109.16 88.5,-121.16 ; 88.5,-95.57 130,-95.57 130,-83.57 88.5,-83.57 88.5,-95.57 ; 88.5,-69.98 130,-69.98 130,-57.98 88.5,-57.98 88.5,-69.98 ; 88.5,-44.39 130,-44.39 130,-32.39 88.5,-32.39 88.5,-44.39 ; 88.5,-18.8 130,-18.8 130,-6.8 88.5,-6.8 88.5,-18.8 ; 88.5,6.8 130,6.8 130,18.8 88.5,18.8 88.5,6.8 ; 88.5,32.39 130,32.39 130,44.39 88.5,44.39 88.5,32.39 ; 88.5,57.98 130,57.98 130,69.98 88.5,69.98 88.5,57.98 ; 88.5,83.57 130,83.57 130,95.57 88.5,95.57 88.5,83.57 ; 88.5,109.16 130,109.16 130,121.16 88.5,121.16 88.5,109.16 ; 88.5,134.75 130,134.75 130,146.75 88.5,146.75 88.5,134.75 ; 88.5,160.34 130,160.34 130,172.34 88.5,172.34 88.5,160.34
Mech 15:
  lines w6: -154,-203 154,-203 154,203 -154,203 -154,-203
3D body: height 10, standoff 0, extent 0,0 10,10
3D body "TSSOP-28.stp": height 44.49, standoff 0, extent -125.98,-190.94 125.99,190.95

## TVSOP-14_L (DGV14) [mil]
height 47.24
pads (14):
  rect 46x7 smd paste+0 mask+0: 1(-113,47.24) 2(-113,31.5) 3(-113,15.75) 4(-113,0) 5(-113,-15.75) 6(-113,-31.5) 7(-113,-47.24) 8(113,-47.24) 9(113,-31.5) 10(113,-15.75) 11(113,0) 12(113,15.75) 13(113,31.5) 14(113,47.24)
Top Overlay:
  region: 146,-8.25 156,-8.25 156,-23.25 146,-23.25
  lines w6: -93.5,-63.84 -93.5,-78 93.5,-78 93.5,-63.84 ; -93.5,63.84 -93.5,78 93.5,78 93.5,63.84
Mech Misc 1:
  lines w0: -12,73 ccw(c0,73) 12,73
  lines w1: -130,-51.74 -88.5,-51.74 -88.5,-42.74 -130,-42.74 -130,-51.74 ; -130,-36 -88.5,-36 -88.5,-27 -130,-27 -130,-36 ; -130,-20.25 -88.5,-20.25 -88.5,-11.25 -130,-11.25 -130,-20.25 ; -130,-4.5 -88.5,-4.5 -88.5,4.5 -130,4.5 -130,-4.5 ; -130,11.25 -88.5,11.25 -88.5,20.25 -130,20.25 -130,11.25 ; -130,27 -88.5,27 -88.5,36 -130,36 -130,27 ; -130,42.74 -88.5,42.74 -88.5,51.74 -130,51.74 -130,42.74 ; -88.5,-73 -88.5,73 88.5,73 88.5,-73 -88.5,-73 ; 88.5,-51.74 130,-51.74 130,-42.74 88.5,-42.74 88.5,-51.74 ; 88.5,-36 130,-36 130,-27 88.5,-27 88.5,-36 ; 88.5,-20.25 130,-20.25 130,-11.25 88.5,-11.25 88.5,-20.25 ; 88.5,-4.5 130,-4.5 130,4.5 88.5,4.5 88.5,-4.5 ; 88.5,11.25 130,11.25 130,20.25 88.5,20.25 88.5,11.25 ; 88.5,27 130,27 130,36 88.5,36 88.5,27 ; 88.5,42.74 130,42.74 130,51.74 88.5,51.74 88.5,42.74
Mech 15:
  lines w6: -140,-54.74 -92.5,-54.74 -92.5,-77 92.5,-77 92.5,-54.74 140,-54.74 140,54.74 92.5,54.74 92.5,77 -92.5,77 -92.5,54.74 -140,54.74 -140,-54.74
3D body: height 10, standoff 0, extent 0,0 10,10
3D body "DGV14.step": height 47.09, standoff 0, extent -130,-72.99 130,72.99

## TVSOP-14_M (DGV14) [mil]
height 47.24
pads (14):
  rect 63.5x9 smd paste+0 mask+0: 1(-120.25,47.24) 2(-120.25,31.5) 3(-120.25,15.75) 4(-120.25,0) 5(-120.25,-15.75) 6(-120.25,-31.5) 7(-120.25,-47.24) 8(120.25,-47.24) 9(120.25,-31.5) 10(120.25,-15.75) 11(120.25,0) 12(120.25,15.75) 13(120.25,31.5) 14(120.25,47.24)
Top Overlay:
  region: 162,-8.25 172,-8.25 172,-23.25 162,-23.25
  lines w6: -93.5,-64.84 -93.5,-78 93.5,-78 93.5,-64.84 ; -93.5,64.84 -93.5,78 93.5,78 93.5,64.84
Mech Misc 1:
  lines w0: -12,73 ccw(c0,73) 12,73
  lines w1: -130,-51.74 -130,-42.74 -88.5,-42.74 -88.5,-51.74 -130,-51.74 ; -130,-36 -130,-27 -88.5,-27 -88.5,-36 -130,-36 ; -130,-20.25 -130,-11.25 -88.5,-11.25 -88.5,-20.25 -130,-20.25 ; -130,-4.5 -130,4.5 -88.5,4.5 -88.5,-4.5 -130,-4.5 ; -130,11.25 -130,20.25 -88.5,20.25 -88.5,11.25 -130,11.25 ; -130,27 -130,36 -88.5,36 -88.5,27 -130,27 ; -130,42.74 -130,51.74 -88.5,51.74 -88.5,42.74 -130,42.74 ; -88.5,-73 88.5,-73 88.5,73 -88.5,73 -88.5,-73 ; 88.5,-51.74 88.5,-42.74 130,-42.74 130,-51.74 88.5,-51.74 ; 88.5,-36 88.5,-27 130,-27 130,-36 88.5,-36 ; 88.5,-20.25 88.5,-11.25 130,-11.25 130,-20.25 88.5,-20.25 ; 88.5,-4.5 88.5,4.5 130,4.5 130,-4.5 88.5,-4.5 ; 88.5,11.25 88.5,20.25 130,20.25 130,11.25 88.5,11.25 ; 88.5,27 88.5,36 130,36 130,27 88.5,27 ; 88.5,42.74 88.5,51.74 130,51.74 130,42.74 88.5,42.74
Mech 15:
  lines w6: -172,-71.74 -172,71.74 -108.5,71.74 -108.5,93 108.5,93 108.5,71.74 172,71.74 172,-71.74 108.5,-71.74 108.5,-93 -108.5,-93 -108.5,-71.74 -172,-71.74
3D body: height 10, standoff 0, extent 0,0 10,10
3D body "DGV14.step": height 47.09, standoff 0, extent -130,-72.99 130,73

## TVSOP-14_N (DGV14) [mil]
height 47.24
pads (14):
  rect 66x9 smd: 1(-111,47.24) 2(-111,31.5) 3(-111,15.75) 4(-111,0) 5(-111,-15.75) 6(-111,-31.5) 7(-111,-47.24) 8(111,-47.24) 9(111,-31.5) 10(111,-15.75) 11(111,0) 12(111,15.75) 13(111,31.5) 14(111,47.24)
Top Overlay:
  region: 154,-8.25 164,-8.25 164,-23.25 154,-23.25
  lines w6: -88.5,-73 88.5,-73 ; -88.5,73 88.5,73 ; -12,73 ccw(c0,73) 12,73
Mech Misc 1:
  lines w0: -12,73 ccw(c0,73) 12,73
  lines w1: -130,-51.74 -88.5,-51.74 -88.5,-42.74 -130,-42.74 -130,-51.74 ; -130,-36 -88.5,-36 -88.5,-27 -130,-27 -130,-36 ; -130,-20.25 -88.5,-20.25 -88.5,-11.25 -130,-11.25 -130,-20.25 ; -130,-4.5 -88.5,-4.5 -88.5,4.5 -130,4.5 -130,-4.5 ; -130,11.25 -88.5,11.25 -88.5,20.25 -130,20.25 -130,11.25 ; -130,27 -88.5,27 -88.5,36 -130,36 -130,27 ; -130,42.74 -88.5,42.74 -88.5,51.74 -130,51.74 -130,42.74 ; -88.5,-73 -88.5,73 88.5,73 88.5,-73 -88.5,-73 ; 88.5,-51.74 130,-51.74 130,-42.74 88.5,-42.74 88.5,-51.74 ; 88.5,-36 130,-36 130,-27 88.5,-27 88.5,-36 ; 88.5,-20.25 130,-20.25 130,-11.25 88.5,-11.25 88.5,-20.25 ; 88.5,-4.5 130,-4.5 130,4.5 88.5,4.5 88.5,-4.5 ; 88.5,11.25 130,11.25 130,20.25 88.5,20.25 88.5,11.25 ; 88.5,27 130,27 130,36 88.5,36 88.5,27 ; 88.5,42.74 130,42.74 130,51.74 88.5,51.74 88.5,42.74
Mech 15:
  lines w6: -154,-83 154,-83 154,83 -154,83 -154,-83
3D body: height 10, standoff 0, extent 0,0 10,10
3D body "DGV14.step": height 47.09, standoff 0, extent -130,-72.99 130,72.99